# Altium schematic symbol library FPGA_Xilinx_Virtex5.SchLib: 41 symbols (part 25 of 27)
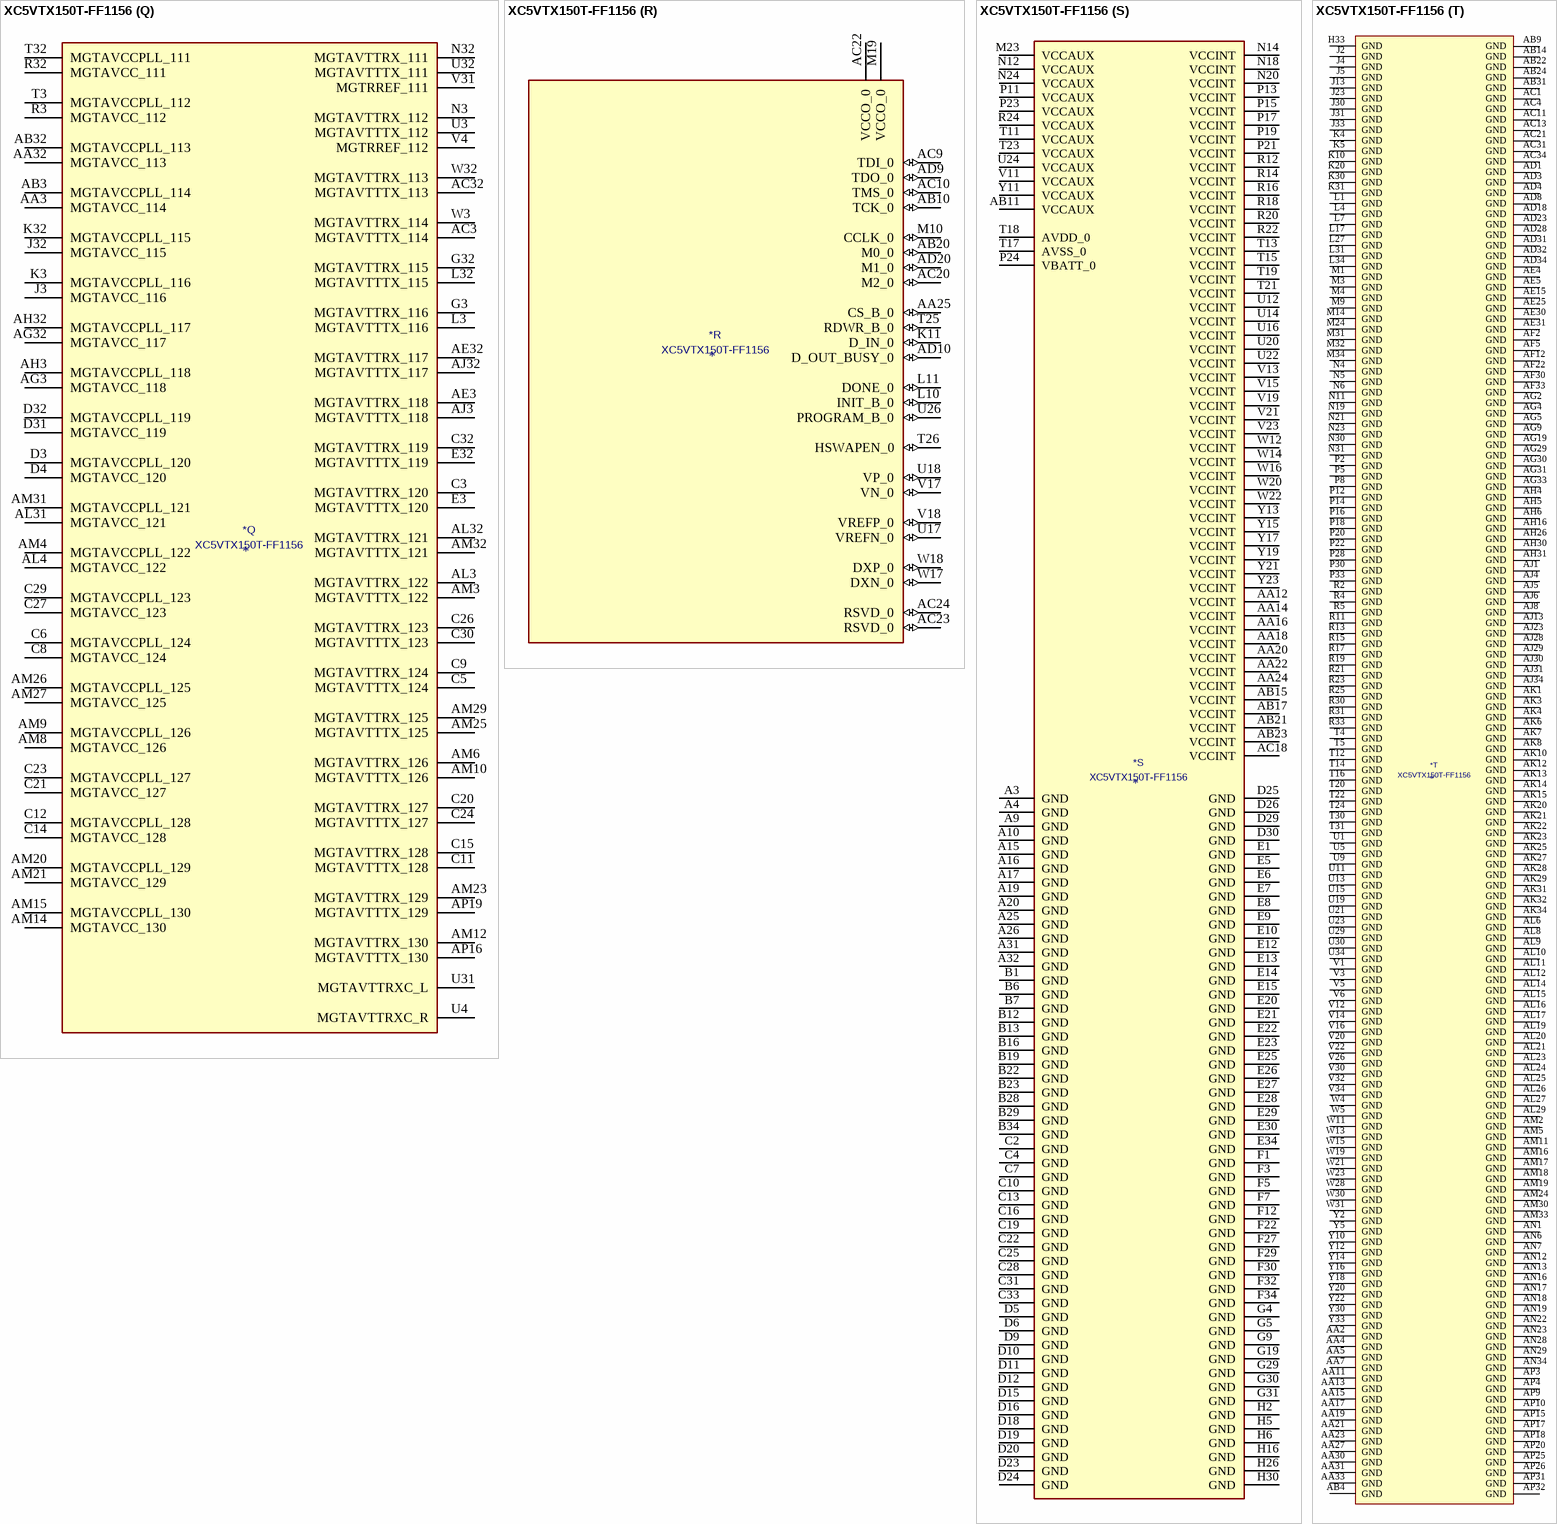
[diagram p161: symbol XC5VTX150T-FF1156]

## XC5VTX150T-FF1156
designator *  value XC5VTX150T-FF1156
ki_keywords: FPGA; ki_description: Virtex 5 TXT 150 XC5VTX150T-FF1156
part A pins: AA26 IO_L13P_11 (io), AA28 IO_L7P_11 (io), AA29 IO_L7N_11 (io), AB25 IO_L15P_SM13P_11 (io), AB26 IO_L13N_11 (io), AB27 IO_L11P_CC_SM14P_11 (io), AB28 IO_L3N_11 (io), AB29 VCCO_11 (power), AB30 IO_L14P_11 (io), AC25 IO_L15N_SM13N_11 (io), AC26 VCCO_11 (power), AC27 IO_L11N_CC_SM14N_11 (io), AC28 IO_L3P_11 (io), AC29 IO_L12N_VRP_11 (io), AC30 IO_L14N_VREF_11 (io), AD25 IO_L0P_11 (io), AD26 IO_L2P_11 (io), AD27 IO_L2N_11 (io), AD29 IO_L5N_11 (io), AD30 IO_L12P_VRN_11 (io), AE26 IO_L0N_11 (io), AE27 IO_L1N_11 (io), AE28 IO_L5P_11 (io), AE29 IO_L10N_CC_SM15N_11 (io), AF27 VCCO_11 (power), AF28 IO_L1P_11 (io), AF29 IO_L10P_CC_SM15P_11 (io), AG28 IO_L9P_CC_11 (io), AH29 IO_L9N_CC_11 (io), H15 IO_L1P_A17_1 (io), J15 IO_L1N_A16_1 (io), J16 IO_L0N_A18_1 (io), K15 VCCO_1 (power), K16 IO_L2N_A14_D30_1 (io), K17 IO_L0P_A19_1 (io), L12 VCCO_1 (power), L13 IO_L5N_A8_D24_1 (io), L14 IO_L5P_A9_D25_1 (io), L15 IO_L4N_VREF_A10_D26_1 (io), L16 IO_L2P_A15_D31_1 (io), L18 IO_L6N_A6_D22_1 (io), M11 IO_L7P_A5_D21_1 (io), M12 IO_L7N_A4_D20_1 (io), M13 IO_L9P_CC_A1_D17_1 (io), M15 IO_L3P_A13_D29_1 (io), M16 IO_L4P_A11_D27_1 (io), M17 IO_L6P_A7_D23_1 (io), M18 IO_L8P_CC_A3_D19_1 (io), N13 IO_L9N_CC_A0_D16_1 (io), N15 IO_L3N_A12_D28_1 (io), N16 VCCO_1 (power), N17 IO_L8N_CC_A2_D18_1 (io), U25 IO_L8P_CC_11 (io), V24 IO_L19P_SM9P_11 (io), V25 IO_L8N_CC_11 (io), V27 IO_L4N_VREF_11 (io), W24 IO_L18N_SM10N_11 (io), W25 IO_L19N_SM9N_11 (io), W26 IO_L17N_SM11N_11 (io), W27 IO_L4P_11 (io), W29 IO_L16P_SM12P_11 (io), Y24 IO_L18P_SM10P_11 (io), Y25 VCCO_11 (power), Y26 IO_L17P_SM11P_11 (io), Y27 IO_L6N_11 (io), Y28 IO_L6P_11 (io), Y29 IO_L16N_SM12N_11 (io)
part B pins: AD21 IO_L1P_SM7P_13 (io), AD22 IO_L3P_SM5P_13 (io), AD24 IO_L16N_13 (io), AE20 VCCO_13 (power), AE21 IO_L1N_SM7N_13 (io), AE22 IO_L3N_SM5N_13 (io), AE23 IO_L16P_13 (io), AE24 IO_L8P_CC_SM1P_13 (io), AF18 IO_L5N_SM4N_13 (io), AF19 IO_L5P_SM4P_13 (io), AF20 IO_L10P_CC_13 (io), AF21 IO_L14P_13 (io), AF23 IO_L18N_13 (io), AF24 IO_L18P_13 (io), AF25 IO_L8N_CC_SM1N_13 (io), AF26 IO_L0P_SM8P_13 (io), AG20 IO_L10N_CC_13 (io), AG21 IO_L14N_VREF_13 (io), AG22 IO_L17P_13 (io), AG23 IO_L17N_13 (io), AG24 VCCO_13 (power), AG25 IO_L13N_13 (io), AG26 IO_L2P_SM6P_13 (io), AG27 IO_L0N_SM8N_13 (io), AH19 IO_L7N_SM2N_13 (io), AH20 IO_L7P_SM2P_13 (io), AH21 VCCO_13 (power), AH22 IO_L19N_13 (io), AH23 IO_L15P_13 (io), AH24 IO_L15N_13 (io), AH25 IO_L13P_13 (io), AH27 IO_L2N_SM6N_13 (io), AH28 IO_L4P_13 (io), AJ19 IO_L9N_CC_SM0N_13 (io), AJ20 IO_L12P_VRN_13 (io), AJ21 IO_L12N_VRP_13 (io), AJ22 IO_L19P_13 (io), AJ24 IO_L11P_CC_13 (io), AJ25 IO_L6P_SM3P_13 (io), AJ26 VCCO_13 (power), AJ27 IO_L4N_VREF_13 (io), AK19 IO_L9P_CC_SM0P_13 (io), AK24 IO_L11N_CC_13 (io), AK26 IO_L6N_SM3N_13 (io), E11 IO_L4N_VREF_12 (io), F6 IO_L7P_12 (io), F8 IO_L0N_12 (io), F9 IO_L0P_12 (io), F10 IO_L2P_12 (io), F11 IO_L4P_12 (io), F13 IO_L13P_12 (io), F14 IO_L13N_12 (io), G6 IO_L7N_12 (io), G7 VCCO_12 (power), G8 IO_L5P_12 (io), G10 IO_L2N_12 (io), G11 IO_L6N_12 (io), G12 IO_L6P_12 (io), G13 IO_L11N_CC_12 (io), G14 VCCO_12 (power), G15 IO_L15P_12 (io), H7 IO_L9P_CC_12 (io), H8 IO_L5N_12 (io), H9 IO_L3N_12 (io), H10 IO_L3P_12 (io), H11 VCCO_12 (power), H12 IO_L11P_CC_12 (io), H13 IO_L17P_12 (io), H14 IO_L15N_12 (io), J6 IO_L12N_VRP_12 (io), J7 IO_L9N_CC_12 (io), J8 VCCO_12 (power), J9 IO_L10N_CC_12 (io), J10 IO_L1N_12 (io), J11 IO_L1P_12 (io), J12 IO_L8N_CC_12 (io), J14 IO_L17N_12 (io), K6 IO_L12P_VRN_12 (io), K7 IO_L18N_12 (io), K8 IO_L10P_CC_12 (io), K9 IO_L14N_VREF_12 (io), K12 IO_L8P_CC_12 (io), K13 IO_L19P_12 (io), K14 IO_L19N_12 (io), L6 IO_L18P_12 (io), L8 IO_L14P_12 (io), L9 IO_L16N_12 (io), M8 IO_L16P_12 (io)
part C pins: AA6 IO_L2P_14 (io), AA8 IO_L0N_14 (io), AA9 IO_L8N_CC_14 (io), AA10 IO_L8P_CC_14 (io), AB8 IO_L0P_14 (io), AB16 IO_L8N_D2_FS2_2 (io), AB18 IO_L9P_D1_FS1_2 (io), AB19 VCCO_2 (power), AC14 IO_L0P_CC_RS1_2 (io), AC15 IO_L8P_D3_2 (io), AC16 VCCO_2 (power), AC17 IO_L7P_D5_2 (io), AC19 IO_L9N_D0_FS0_2 (io), AD13 VCCO_2 (power), AD14 IO_L0N_CC_RS0_2 (io), AD15 IO_L6P_D7_2 (io), AD16 IO_L6N_D6_2 (io), AD17 IO_L7N_D4_2 (io), AD19 IO_L1N_CC_A24_2 (io), AE13 IO_L2P_A23_2 (io), AE14 IO_L4P_FCS_B_2 (io), AE16 IO_L5P_FWE_B_2 (io), AE17 IO_L3N_A20_2 (io), AE18 IO_L3P_A21_2 (io), AE19 IO_L1P_CC_A25_2 (io), AF14 IO_L2N_A22_2 (io), AF15 IO_L4N_VREF_FOE_B_MOSI_2 (io), AF16 IO_L5N_CSO_B_2 (io), L5 IO_L17P_14 (io), M5 IO_L17N_14 (io), M6 IO_L18N_14 (io), M7 IO_L18P_14 (io), N7 VCCO_14 (power), N8 IO_L16P_14 (io), N9 IO_L12N_VRP_14 (io), N10 IO_L14N_VREF_14 (io), P6 IO_L15N_14 (io), P7 IO_L16N_14 (io), P9 IO_L12P_VRN_14 (io), P10 IO_L14P_14 (io), R6 IO_L13P_14 (io), R7 IO_L15P_14 (io), R8 IO_L9P_CC_14 (io), R9 IO_L9N_CC_14 (io), R10 VCCO_14 (power), T6 IO_L13N_14 (io), T7 VCCO_14 (power), T8 IO_L7N_14 (io), T9 IO_L1P_14 (io), T10 IO_L1N_14 (io), U6 IO_L11N_CC_14 (io), U7 IO_L11P_CC_14 (io), U8 IO_L7P_14 (io), U10 IO_L3N_14 (io), V7 IO_L6N_14 (io), V8 IO_L5P_14 (io), V9 IO_L5N_14 (io), V10 IO_L3P_14 (io), W6 IO_L6P_14 (io), W7 IO_L4N_VREF_14 (io), W8 VCCO_14 (power), W9 IO_L10P_CC_14 (io), W10 IO_L10N_CC_14 (io), Y6 IO_L2N_14 (io), Y7 IO_L4P_14 (io), Y8 IO_L19P_14 (io), Y9 IO_L19N_14 (io)
part D pins: AB5 IO_L6P_26 (io), AB6 IO_L8P_CC_26 (io), AB7 IO_L8N_CC_26 (io), AC5 IO_L6N_26 (io), AC6 VCCO_26 (power), AC7 IO_L4N_VREF_26 (io), AC8 IO_L4P_26 (io), AC12 IO_L11N_CC_26 (io), AD5 IO_L2P_26 (io), AD6 IO_L2N_26 (io), AD7 IO_L0P_26 (io), AD11 IO_L18P_26 (io), AD12 IO_L11P_CC_26 (io), AE6 IO_L1P_26 (io), AE7 IO_L0N_26 (io), AE8 IO_L5P_26 (io), AE9 IO_L7P_26 (io), AE10 VCCO_26 (power), AE11 IO_L16P_26 (io), AE12 IO_L18N_26 (io), AF6 IO_L1N_26 (io), AF7 VCCO_26 (power), AF8 IO_L5N_26 (io), AF9 IO_L7N_26 (io), AF10 IO_L9P_CC_26 (io), AF11 IO_L16N_26 (io), AG6 IO_L3P_26 (io), AG7 IO_L3N_26 (io), AG8 IO_L10N_CC_26 (io), AG10 IO_L9N_CC_26 (io), AG11 IO_L19N_26 (io), AH7 IO_L12N_VRP_26 (io), AH8 IO_L10P_CC_26 (io), AH9 IO_L14N_VREF_26 (io), AH10 IO_L19P_26 (io), AH11 VCCO_26 (power), AH12 IO_L13N_26 (io), AJ7 IO_L12P_VRN_26 (io), AJ9 IO_L17P_26 (io), AJ10 IO_L14P_26 (io), AJ11 IO_L15P_26 (io), AJ12 IO_L13P_26 (io), AK9 IO_L17N_26 (io), AK11 IO_L15N_26 (io), F28 IO_L0P_23 (io), G27 IO_L2P_23 (io), G28 IO_L0N_23 (io), H27 IO_L2N_23 (io), H28 IO_L6P_23 (io), H29 IO_L6N_23 (io), J26 IO_L4P_23 (io), J27 IO_L4N_VREF_23 (io), J28 VCCO_23 (power), J29 IO_L8P_CC_23 (io), K26 IO_L11N_CC_23 (io), K27 IO_L13N_23 (io), K28 IO_L13P_23 (io), K29 IO_L8N_CC_23 (io), L26 IO_L11P_CC_23 (io), L28 IO_L15N_23 (io), L29 IO_L15P_23 (io), L30 IO_L17N_23 (io), M25 IO_L14N_VREF_23 (io), M26 IO_L14P_23 (io), M27 IO_L19P_23 (io), M28 IO_L19N_23 (io), M29 VCCO_23 (power), M30 IO_L17P_23 (io), N25 IO_L3P_23 (io), N26 VCCO_23 (power), N27 IO_L12P_VRN_23 (io), N28 IO_L12N_VRP_23 (io), N29 IO_L18N_23 (io), P25 IO_L1P_23 (io), P26 IO_L3N_23 (io), P27 IO_L5N_23 (io), P29 IO_L18P_23 (io), R26 IO_L1N_23 (io), R27 IO_L10P_CC_23 (io), R28 IO_L5P_23 (io), R29 IO_L16N_23 (io), T27 VCCO_23 (power), T28 IO_L10N_CC_23 (io), T29 IO_L16P_23 (io), U27 IO_L7N_23 (io), U28 IO_L7P_23 (io), V28 IO_L9N_CC_23 (io), V29 IO_L9P_CC_23 (io)
part E pins: A18 VCCO_3 (power), B17 IO_L4P_GC_3 (io), B18 IO_L1P_CC_GC_3 (io), C17 IO_L4N_GC_VREF_3 (io), C18 IO_L1N_CC_GC_3 (io), D17 IO_L2P_GC_VRN_3 (io), E16 IO_L8P_GC_3 (io), E17 IO_L2N_GC_VRP_3 (io), E18 IO_L3P_GC_3 (io), E19 IO_L3N_GC_3 (io), E24 IO_L8N_CC_27 (io), F15 IO_L8N_GC_3 (io), F16 IO_L6P_GC_3 (io), F17 VCCO_3 (power), F18 IO_L5P_GC_3 (io), F19 IO_L4P_27 (io), F20 IO_L4N_VREF_27 (io), F21 IO_L2P_27 (io), F23 IO_L6N_27 (io), F24 IO_L8P_CC_27 (io), F25 IO_L11N_CC_27 (io), F26 IO_L13N_27 (io), G16 IO_L6N_GC_3 (io), G17 IO_L0P_CC_GC_3 (io), G18 IO_L5N_GC_3 (io), G20 IO_L3N_27 (io), G21 IO_L2N_27 (io), G22 IO_L1P_27 (io), G23 IO_L6P_27 (io), G24 VCCO_27 (power), G25 IO_L11P_CC_27 (io), G26 IO_L13P_27 (io), H17 IO_L0N_CC_GC_3 (io), H18 IO_L7P_GC_3 (io), H19 IO_L3P_27 (io), H20 IO_L5N_27 (io), H21 VCCO_27 (power), H22 IO_L1N_27 (io), H23 IO_L0N_27 (io), H24 IO_L0P_27 (io), H25 IO_L15N_27 (io), J17 IO_L7N_GC_3 (io), J18 VCCO_3 (power), J19 IO_L7N_27 (io), J20 IO_L5P_27 (io), J21 IO_L10P_CC_27 (io), J22 IO_L12P_VRN_27 (io), J24 IO_L17N_27 (io), J25 IO_L15P_27 (io), K18 IO_L9P_GC_3 (io), K19 IO_L7P_27 (io), K21 IO_L10N_CC_27 (io), K22 IO_L12N_VRP_27 (io), K23 IO_L14N_VREF_27 (io), K24 IO_L17P_27 (io), K25 VCCO_27 (power), L19 IO_L9N_GC_3 (io), L20 IO_L9N_CC_27 (io), L21 IO_L16P_27 (io), L22 VCCO_27 (power), L23 IO_L14P_27 (io), L24 IO_L19P_27 (io), L25 IO_L19N_27 (io), M20 IO_L9P_CC_27 (io), M21 IO_L16N_27 (io), M22 IO_L18N_27 (io), N22 IO_L18P_27 (io)
part F pins: AF13 IO_L1N_GC_D12_4 (io), AF17 VCCO_4 (power), AG12 IO_L3N_GC_D8_4 (io), AG13 IO_L1P_GC_D13_4 (io), AG14 VCCO_4 (power), AG15 IO_L7N_GC_VRP_4 (io), AG16 IO_L8N_CC_GC_4 (io), AG17 IO_L8P_CC_GC_4 (io), AG18 IO_L0P_GC_D15_4 (io), AH13 IO_L3P_GC_D9_4 (io), AH14 IO_L5N_GC_4 (io), AH15 IO_L7P_GC_VRN_4 (io), AH17 IO_L6N_GC_4 (io), AH18 IO_L0N_GC_D14_4 (io), AJ14 IO_L5P_GC_4 (io), AJ15 IO_L9N_CC_GC_4 (io), AJ16 IO_L9P_CC_GC_4 (io), AJ17 IO_L6P_GC_4 (io), AJ18 VCCO_4 (power), AK16 IO_L4N_GC_VREF_4 (io), AK17 IO_L4P_GC_4 (io), AK18 IO_L2P_GC_D11_4 (io), AL18 IO_L2N_GC_D10_4 (io)
part G pins: M2 MGTTXP0_112 (io), M33 MGTTXP0_111 (io), N1 MGTRXP0_112 (io), N2 MGTTXN0_112 (io), N33 MGTTXN0_111 (io), N34 MGTRXP0_111 (io), P1 MGTRXN0_112 (io), P3 MGTREFCLKN_112 (io), P4 MGTREFCLKP_112 (io), P31 MGTREFCLKP_111 (io), P32 MGTREFCLKN_111 (io), P34 MGTRXN0_111 (io), R1 MGTRXN1_112 (io), R34 MGTRXN1_111 (io), T1 MGTRXP1_112 (io), T2 MGTTXN1_112 (io), T33 MGTTXN1_111 (io), T34 MGTRXP1_111 (io), U2 MGTTXP1_112 (io), U33 MGTTXP1_111 (io)
part H pins: AA1 MGTRXN1_114 (io), AA34 MGTRXN1_113 (io), AB1 MGTRXP1_114 (io), AB2 MGTTXN1_114 (io), AB33 MGTTXN1_113 (io), AB34 MGTRXP1_113 (io), AC2 MGTTXP1_114 (io), AC33 MGTTXP1_113 (io), V2 MGTTXP0_114 (io), V33 MGTTXP0_113 (io), W1 MGTRXP0_114 (io), W2 MGTTXN0_114 (io), W33 MGTTXN0_113 (io), W34 MGTRXP0_113 (io), Y1 MGTRXN0_114 (io), Y3 MGTREFCLKN_114 (io), Y4 MGTREFCLKP_114 (io), Y31 MGTREFCLKP_113 (io), Y32 MGTREFCLKN_113 (io), Y34 MGTRXN0_113 (io)
part I pins: F2 MGTTXP0_116 (io), F33 MGTTXP0_115 (io), G1 MGTRXP0_116 (io), G2 MGTTXN0_116 (io), G33 MGTTXN0_115 (io), G34 MGTRXP0_115 (io), H1 MGTRXN0_116 (io), H3 MGTREFCLKN_116 (io), H4 MGTREFCLKP_116 (io), H31 MGTREFCLKP_115 (io), H32 MGTREFCLKN_115 (io), H34 MGTRXN0_115 (io), J1 MGTRXN1_116 (io), J34 MGTRXN1_115 (io), K1 MGTRXP1_116 (io), K2 MGTTXN1_116 (io), K33 MGTTXN1_115 (io), K34 MGTRXP1_115 (io), L2 MGTTXP1_116 (io), L33 MGTTXP1_115 (io)
part J pins: AD2 MGTTXP0_118 (io), AD33 MGTTXP0_117 (io), AE1 MGTRXP0_118 (io), AE2 MGTTXN0_118 (io), AE33 MGTTXN0_117 (io), AE34 MGTRXP0_117 (io), AF1 MGTRXN0_118 (io), AF3 MGTREFCLKN_118 (io), AF4 MGTREFCLKP_118 (io), AF31 MGTREFCLKP_117 (io), AF32 MGTREFCLKN_117 (io), AF34 MGTRXN0_117 (io), AG1 MGTRXN1_118 (io), AG34 MGTRXN1_117 (io), AH1 MGTRXP1_118 (io), AH2 MGTTXN1_118 (io), AH33 MGTTXN1_117 (io), AH34 MGTRXP1_117 (io), AJ2 MGTTXP1_118 (io), AJ33 MGTTXP1_117 (io)
part K pins: A1 MGTRXN0_120 (io), A2 MGTRXP0_120 (io), A33 MGTRXP0_119 (io), A34 MGTRXN0_119 (io), B2 MGTTXN0_120 (io), B3 MGTTXP0_120 (io), B32 MGTTXP0_119 (io), B33 MGTTXN0_119 (io), C1 MGTRXN1_120 (io), C34 MGTRXN1_119 (io), D1 MGTRXP1_120 (io), D2 MGTTXN1_120 (io), D33 MGTTXN1_119 (io), D34 MGTRXP1_119 (io), E2 MGTTXP1_120 (io), E4 MGTREFCLKN_120 (io), E31 MGTREFCLKN_119 (io), E33 MGTTXP1_119 (io), F4 MGTREFCLKP_120 (io), F31 MGTREFCLKP_119 (io)
part L pins: AK2 MGTTXP0_122 (io), AK5 MGTREFCLKP_122 (io), AK30 MGTREFCLKP_121 (io), AK33 MGTTXP0_121 (io), AL1 MGTRXP0_122 (io), AL2 MGTTXN0_122 (io), AL5 MGTREFCLKN_122 (io), AL30 MGTREFCLKN_121 (io), AL33 MGTTXN0_121 (io), AL34 MGTRXP0_121 (io), AM1 MGTRXN0_122 (io), AM34 MGTRXN0_121 (io), AN2 MGTTXN1_122 (io), AN3 MGTTXP1_122 (io), AN32 MGTTXP1_121 (io), AN33 MGTTXN1_121 (io), AP1 MGTRXN1_122 (io), AP2 MGTRXP1_122 (io), AP33 MGTRXP1_121 (io), AP34 MGTRXN1_121 (io)
part M pins: A5 MGTRXP1_124 (io), A6 MGTRXN1_124 (io), A7 MGTRXN0_124 (io), A8 MGTRXP0_124 (io), A27 MGTRXP0_123 (io), A28 MGTRXN0_123 (io), A29 MGTRXN1_123 (io), A30 MGTRXP1_123 (io), B4 MGTTXP1_124 (io), B5 MGTTXN1_124 (io), B8 MGTTXN0_124 (io), B9 MGTTXP0_124 (io), B26 MGTTXP0_123 (io), B27 MGTTXN0_123 (io), B30 MGTTXN1_123 (io), B31 MGTTXP1_123 (io), D7 MGTREFCLKN_124 (io), D8 MGTREFCLKP_124 (io), D27 MGTREFCLKP_123 (io), D28 MGTREFCLKN_123 (io)
part N pins: AL7 MGTREFCLKP_126 (io), AL28 MGTREFCLKP_125 (io), AM7 MGTREFCLKN_126 (io), AM28 MGTREFCLKN_125 (io), AN4 MGTTXP0_126 (io), AN5 MGTTXN0_126 (io), AN8 MGTTXN1_126 (io), AN9 MGTTXP1_126 (io), AN26 MGTTXP1_125 (io), AN27 MGTTXN1_125 (io), AN30 MGTTXN0_125 (io), AN31 MGTTXP0_125 (io), AP5 MGTRXP0_126 (io), AP6 MGTRXN0_126 (io), AP7 MGTRXN1_126 (io), AP8 MGTRXP1_126 (io), AP27 MGTRXP1_125 (io), AP28 MGTRXN1_125 (io), AP29 MGTRXN0_125 (io), AP30 MGTRXP0_125 (io)
part O pins: A11 MGTRXP1_128 (io), A12 MGTRXN1_128 (io), A13 MGTRXN0_128 (io), A14 MGTRXP0_128 (io), A21 MGTRXP0_127 (io), A22 MGTRXN0_127 (io), A23 MGTRXN1_127 (io), A24 MGTRXP1_127 (io), B10 MGTTXP1_128 (io), B11 MGTTXN1_128 (io), B14 MGTTXN0_128 (io), B15 MGTTXP0_128 (io), B20 MGTTXP0_127 (io), B21 MGTTXN0_127 (io), B24 MGTTXN1_127 (io), B25 MGTTXP1_127 (io), D13 MGTREFCLKN_128 (io), D14 MGTREFCLKP_128 (io), D21 MGTREFCLKP_127 (io), D22 MGTREFCLKN_127 (io)
part P pins: AL13 MGTREFCLKP_130 (io), AL22 MGTREFCLKP_129 (io), AM13 MGTREFCLKN_130 (io), AM22 MGTREFCLKN_129 (io), AN10 MGTTXP0_130 (io), AN11 MGTTXN0_130 (io), AN14 MGTTXN1_130 (io), AN15 MGTTXP1_130 (io), AN20 MGTTXP1_129 (io), AN21 MGTTXN1_129 (io), AN24 MGTTXN0_129 (io), AN25 MGTTXP0_129 (io), AP11 MGTRXP0_130 (io), AP12 MGTRXN0_130 (io), AP13 MGTRXN1_130 (io), AP14 MGTRXP1_130 (io), AP21 MGTRXP1_129 (io), AP22 MGTRXN1_129 (io), AP23 MGTRXN0_129 (io), AP24 MGTRXP0_129 (io)
part Q pins: AA3 MGTAVCC_114 (power), AA32 MGTAVCC_113 (power), AB3 MGTAVCCPLL_114 (power), AB32 MGTAVCCPLL_113 (power), AC3 MGTAVTTTX_114 (power), AC32 MGTAVTTTX_113 (power), AE3 MGTAVTTRX_118 (power), AE32 MGTAVTTRX_117 (power), AG3 MGTAVCC_118 (power), AG32 MGTAVCC_117 (power), AH3 MGTAVCCPLL_118 (power), AH32 MGTAVCCPLL_117 (power), AJ3 MGTAVTTTX_118 (power), AJ32 MGTAVTTTX_117 (power), AL3 MGTAVTTRX_122 (power), AL4 MGTAVCC_122 (power), AL31 MGTAVCC_121 (power), AL32 MGTAVTTRX_121 (power), AM3 MGTAVTTTX_122 (power), AM4 MGTAVCCPLL_122 (power), AM6 MGTAVTTRX_126 (power), AM8 MGTAVCC_126 (power), AM9 MGTAVCCPLL_126 (power), AM10 MGTAVTTTX_126 (power), AM12 MGTAVTTRX_130 (power), AM14 MGTAVCC_130 (power), AM15 MGTAVCCPLL_130 (power), AM20 MGTAVCCPLL_129 (power), AM21 MGTAVCC_129 (power), AM23 MGTAVTTRX_129 (power), AM25 MGTAVTTTX_125 (power), AM26 MGTAVCCPLL_125 (power), AM27 MGTAVCC_125 (power), AM29 MGTAVTTRX_125 (power), AM31 MGTAVCCPLL_121 (power), AM32 MGTAVTTTX_121 (power), AP16 MGTAVTTTX_130 (power), AP19 MGTAVTTTX_129 (power), C3 MGTAVTTRX_120 (power), C5 MGTAVTTTX_124 (power), C6 MGTAVCCPLL_124 (power), C8 MGTAVCC_124 (power), C9 MGTAVTTRX_124 (power), C11 MGTAVTTTX_128 (power), C12 MGTAVCCPLL_128 (power), C14 MGTAVCC_128 (power), C15 MGTAVTTRX_128 (power), C20 MGTAVTTRX_127 (power), C21 MGTAVCC_127 (power), C23 MGTAVCCPLL_127 (power), C24 MGTAVTTTX_127 (power), C26 MGTAVTTRX_123 (power), C27 MGTAVCC_123 (power), C29 MGTAVCCPLL_123 (power), C30 MGTAVTTTX_123 (power), C32 MGTAVTTRX_119 (power), D3 MGTAVCCPLL_120 (power), D4 MGTAVCC_120 (power), D31 MGTAVCC_119 (power), D32 MGTAVCCPLL_119 (power), E3 MGTAVTTTX_120 (power), E32 MGTAVTTTX_119 (power), G3 MGTAVTTRX_116 (power), G32 MGTAVTTRX_115 (power), J3 MGTAVCC_116 (power), J32 MGTAVCC_115 (power), K3 MGTAVCCPLL_116 (power), K32 MGTAVCCPLL_115 (power), L3 MGTAVTTTX_116 (power), L32 MGTAVTTTX_115 (power), N3 MGTAVTTRX_112 (power), N32 MGTAVTTRX_111 (power), R3 MGTAVCC_112 (power), R32 MGTAVCC_111 (power), T3 MGTAVCCPLL_112 (power), T32 MGTAVCCPLL_111 (power), U3 MGTAVTTTX_112 (power), U4 MGTAVTTRXC_R (power), U31 MGTAVTTRXC_L (power), U32 MGTAVTTTX_111 (power), V4 MGTRREF_112 (power), V31 MGTRREF_111 (power), W3 MGTAVTTRX_114 (power), W32 MGTAVTTRX_113 (power)
part R pins: AA25 CS_B_0 (io), AB10 TCK_0 (io), AB20 M0_0 (io), AC9 TDI_0 (io), AC10 TMS_0 (io), AC20 M2_0 (io), AC22 VCCO_0 (power), AC23 RSVD_0 (io), AC24 RSVD_0 (io), AD9 TDO_0 (io), AD10 D_OUT_BUSY_0 (io), AD20 M1_0 (io), K11 D_IN_0 (io), L10 INIT_B_0 (io), L11 DONE_0 (io), M10 CCLK_0 (io), M19 VCCO_0 (power), T25 RDWR_B_0 (io), T26 HSWAPEN_0 (io), U17 VREFN_0 (io), U18 VP_0 (io), U26 PROGRAM_B_0 (io), V17 VN_0 (io), V18 VREFP_0 (io), W17 DXN_0 (io), W18 DXP_0 (io)
part S pins: A3 GND (power), A4 GND (power), A9 GND (power), A10 GND (power), A15 GND (power), A16 GND (power), A17 GND (power), A19 GND (power), A20 GND (power), A25 GND (power), A26 GND (power), A31 GND (power), A32 GND (power), AA12 VCCINT (power), AA14 VCCINT (power), AA16 VCCINT (power), AA18 VCCINT (power), AA20 VCCINT (power), AA22 VCCINT (power), AA24 VCCINT (power), AB11 VCCAUX (power), AB15 VCCINT (power), AB17 VCCINT (power), AB21 VCCINT (power), AB23 VCCINT (power), AC18 VCCINT (power), B1 GND (power), B6 GND (power), B7 GND (power), B12 GND (power), B13 GND (power), B16 GND (power), B19 GND (power), B22 GND (power), B23 GND (power), B28 GND (power), B29 GND (power), B34 GND (power), C2 GND (power), C4 GND (power), C7 GND (power), C10 GND (power), C13 GND (power), C16 GND (power), C19 GND (power), C22 GND (power), C25 GND (power), C28 GND (power), C31 GND (power), C33 GND (power), D5 GND (power), D6 GND (power), D9 GND (power), D10 GND (power), D11 GND (power), D12 GND (power), D15 GND (power), D16 GND (power), D18 GND (power), D19 GND (power), D20 GND (power), D23 GND (power), D24 GND (power), D25 GND (power), D26 GND (power), D29 GND (power), D30 GND (power), E1 GND (power), E5 GND (power), E6 GND (power), E7 GND (power), E8 GND (power), E9 GND (power), E10 GND (power), E12 GND (power), E13 GND (power), E14 GND (power), E15 GND (power), E20 GND (power), E21 GND (power), E22 GND (power), E23 GND (power), E25 GND (power), E26 GND (power), E27 GND (power), E28 GND (power), E29 GND (power), E30 GND (power), E34 GND (power), F1 GND (power), F3 GND (power), F5 GND (power), F7 GND (power), F12 GND (power), F22 GND (power), F27 GND (power), F29 GND (power), F30 GND (power), F32 GND (power), F34 GND (power), G4 GND (power), G5 GND (power), G9 GND (power), G19 GND (power), G29 GND (power), G30 GND (power), G31 GND (power), H2 GND (power), H5 GND (power), H6 GND (power), H16 GND (power), H26 GND (power), H30 GND (power), M23 VCCAUX (power), N12 VCCAUX (power), N14 VCCINT (power), N18 VCCINT (power), N20 VCCINT (power), N24 VCCAUX (power), P11 VCCAUX (power), P13 VCCINT (power), P15 VCCINT (power), P17 VCCINT (power), P19 VCCINT (power), P21 VCCINT (power), P23 VCCAUX (power), P24 VBATT_0 (power), R12 VCCINT (power), R14 VCCINT (power), R16 VCCINT (power), R18 VCCINT (power), R20 VCCINT (power), R22 VCCINT (power), R24 VCCAUX (power), T11 VCCAUX (power), T13 VCCINT (power), T15 VCCINT (power), T17 AVSS_0 (power), T18 AVDD_0 (power), T19 VCCINT (power), T21 VCCINT (power), T23 VCCAUX (power), U12 VCCINT (power), U14 VCCINT (power), U16 VCCINT (power), U20 VCCINT (power), U22 VCCINT (power), U24 VCCAUX (power), V11 VCCAUX (power), V13 VCCINT (power), V15 VCCINT (power), V19 VCCINT (power), V21 VCCINT (power), V23 VCCINT (power), W12 VCCINT (power), W14 VCCINT (power), W16 VCCINT (power), W20 VCCINT (power), W22 VCCINT (power), Y11 VCCAUX (power), Y13 VCCINT (power), Y15 VCCINT (power), Y17 VCCINT (power), Y19 VCCINT (power), Y21 VCCINT (power), Y23 VCCINT (power)
part T pins: AA2 GND (power), AA4 GND (power), AA5 GND (power), AA7 GND (power), AA11 GND (power), AA13 GND (power), AA15 GND (power), AA17 GND (power), AA19 GND (power), AA21 GND (power), AA23 GND (power), AA27 GND (power), AA30 GND (power), AA31 GND (power), AA33 GND (power), AB4 GND (power), AB9 GND (power), AB14 GND (power), AB22 GND (power), AB24 GND (power), AB31 GND (power), AC1 GND (power), AC4 GND (power), AC11 GND (power), AC13 GND (power), AC21 GND (power), AC31 GND (power), AC34 GND (power), AD1 GND (power), AD3 GND (power), AD4 GND (power), AD8 GND (power), AD18 GND (power), AD23 GND (power), AD28 GND (power), AD31 GND (power), AD32 GND (power), AD34 GND (power), AE4 GND (power), AE5 GND (power), AE15 GND (power), AE25 GND (power), AE30 GND (power), AE31 GND (power), AF2 GND (power), AF5 GND (power), AF12 GND (power), AF22 GND (power), AF30 GND (power), AF33 GND (power), AG2 GND (power), AG4 GND (power), AG5 GND (power), AG9 GND (power), AG19 GND (power), AG29 GND (power), AG30 GND (power), AG31 GND (power), AG33 GND (power), AH4 GND (power), AH5 GND (power), AH6 GND (power), AH16 GND (power), AH26 GND (power), AH30 GND (power), AH31 GND (power), AJ1 GND (power), AJ4 GND (power), AJ5 GND (power), AJ6 GND (power), AJ8 GND (power), AJ13 GND (power), AJ23 GND (power), AJ28 GND (power), AJ29 GND (power), AJ30 GND (power), AJ31 GND (power), AJ34 GND (power), AK1 GND (power), AK3 GND (power), AK4 GND (power), AK6 GND (power), AK7 GND (power), AK8 GND (power), AK10 GND (power), AK12 GND (power), AK13 GND (power), AK14 GND (power), AK15 GND (power), AK20 GND (power), AK21 GND (power), AK22 GND (power), AK23 GND (power), AK25 GND (power), AK27 GND (power), AK28 GND (power), AK29 GND (power), AK31 GND (power), AK32 GND (power), AK34 GND (power), AL6 GND (power), AL8 GND (power), AL9 GND (power), AL10 GND (power), AL11 GND (power), AL12 GND (power), AL14 GND (power), AL15 GND (power), AL16 GND (power), AL17 GND (power), AL19 GND (power), AL20 GND (power), AL21 GND (power), AL23 GND (power), AL24 GND (power), AL25 GND (power), AL26 GND (power), AL27 GND (power), AL29 GND (power), AM2 GND (power), AM5 GND (power), AM11 GND (power), AM16 GND (power), AM17 GND (power), AM18 GND (power), AM19 GND (power), AM24 GND (power), AM30 GND (power), AM33 GND (power), AN1 GND (power), AN6 GND (power), AN7 GND (power), AN12 GND (power), AN13 GND (power), AN16 GND (power), AN17 GND (power), AN18 GND (power), AN19 GND (power), AN22 GND (power), AN23 GND (power), AN28 GND (power), AN29 GND (power), AN34 GND (power), AP3 GND (power), AP4 GND (power), AP9 GND (power), AP10 GND (power), AP15 GND (power), AP17 GND (power), AP18 GND (power), AP20 GND (power), AP25 GND (power), AP26 GND (power), AP31 GND (power), AP32 GND (power), H33 GND (power), J2 GND (power), J4 GND (power), J5 GND (power), J13 GND (power), J23 GND (power), J30 GND (power), J31 GND (power), J33 GND (power), K4 GND (power), K5 GND (power), K10 GND (power), K20 GND (power), K30 GND (power), K31 GND (power), L1 GND (power), L4 GND (power), L7 GND (power), L17 GND (power), L27 GND (power), L31 GND (power), L34 GND (power), M1 GND (power), M3 GND (power), M4 GND (power), M9 GND (power), M14 GND (power), M24 GND (power), M31 GND (power), M32 GND (power), M34 GND (power), N4 GND (power), N5 GND (power), N6 GND (power), N11 GND (power), N19 GND (power), N21 GND (power), N23 GND (power), N30 GND (power), N31 GND (power), P2 GND (power), P5 GND (power), P8 GND (power), P12 GND (power), P14 GND (power), P16 GND (power), P18 GND (power), P20 GND (power), P22 GND (power), P28 GND (power), P30 GND (power), P33 GND (power), R2 GND (power), R4 GND (power), R5 GND (power), R11 GND (power), R13 GND (power), R15 GND (power), R17 GND (power), R19 GND (power), R21 GND (power), R23 GND (power), R25 GND (power), R30 GND (power), R31 GND (power), R33 GND (power), T4 GND (power), T5 GND (power), T12 GND (power), T14 GND (power), T16 GND (power), T20 GND (power), T22 GND (power), T24 GND (power), T30 GND (power), T31 GND (power), U1 GND (power), U5 GND (power), U9 GND (power), U11 GND (power), U13 GND (power), U15 GND (power), U19 GND (power), U21 GND (power), U23 GND (power), U29 GND (power), U30 GND (power), U34 GND (power), V1 GND (power), V3 GND (power), V5 GND (power), V6 GND (power), V12 GND (power), V14 GND (power), V16 GND (power), V20 GND (power), V22 GND (power), V26 GND (power), V30 GND (power), V32 GND (power), V34 GND (power), W4 GND (power), W5 GND (power), W11 GND (power), W13 GND (power), W15 GND (power), W19 GND (power), W21 GND (power), W23 GND (power), W28 GND (power), W30 GND (power), W31 GND (power), Y2 GND (power), Y5 GND (power), Y10 GND (power), Y12 GND (power), Y14 GND (power), Y16 GND (power), Y18 GND (power), Y20 GND (power), Y22 GND (power), Y30 GND (power), Y33 GND (power)